# Altium footprint library Lib_001.PcbLib: 429 footprints (part 17 of 28)
Each footprint in its own frame and in the unit in brackets; x right, y up, seen from the top. Pads: shape width x height; smd on the part's side, far side on the other; paste and mask are expansions set on the pad; w line width, h text height; cw(c..) or ccw(c..) is an arc to the next point about the centre after c.
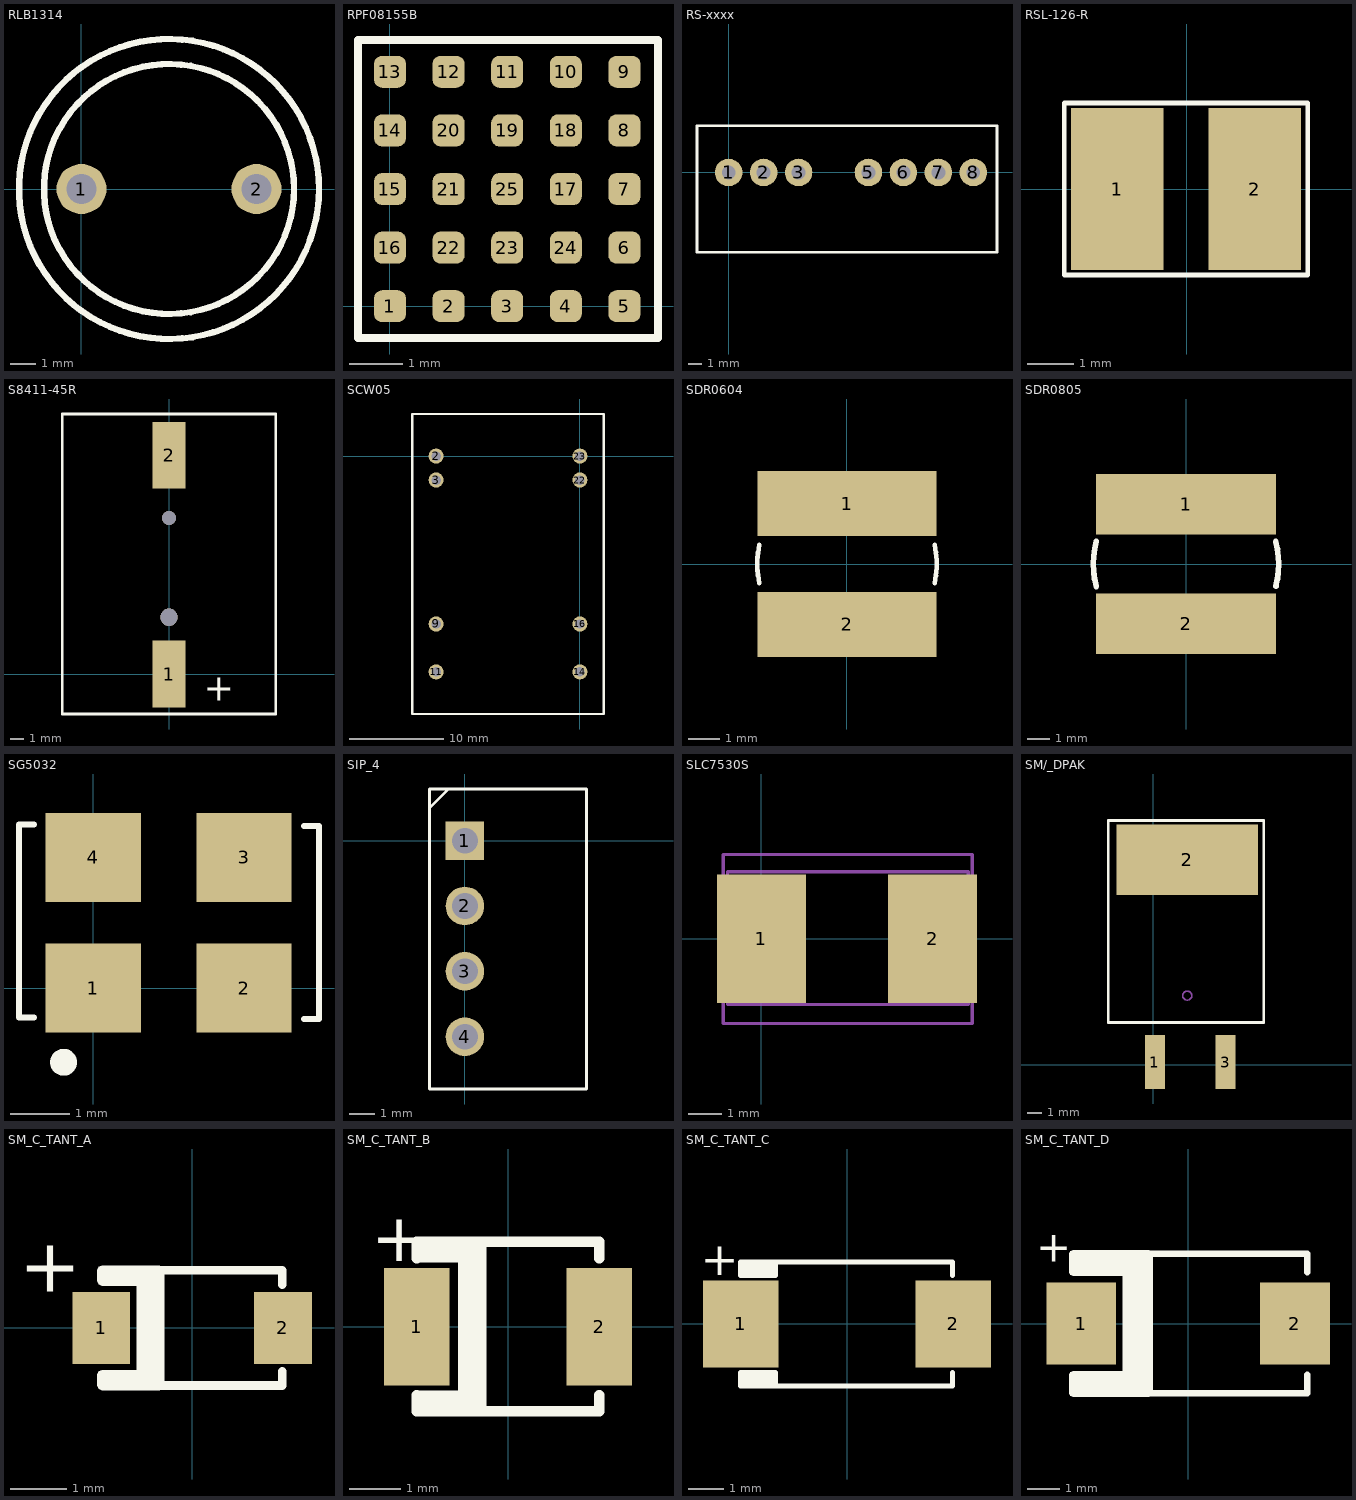
[diagram p16: the footprints below, top view; thin cyan lines are the x and y axes]

## RLB1314 [mm] "RLB1314 Inductor"
height 12
pads (2):
  round 2 hole 1.2: 1(0,0) 2(7,0)
Top Overlay:
  circle w0.254: c3.5,0 r6
  circle w0.254: c3.5,0 r5
Mechanical 1:
  circle w0.1: c3.5,0 r6
  circle w0.1: c3.5,0 r5
3D body: height 1.5, standoff -1.5, extent -0.496,-0.499 0.5,0.499
3D body: height 1.5, standoff -1.5, extent 6.504,-0.499 7.5,0.499
3D body: height 1.5, standoff 0, extent -2.453,-5.988 9.5,5.988
3D body: height 11.5, standoff 1.5, extent -1.46,-4.99 8.5,4.99
3D body: height 11, standoff 10, extent -2.453,-5.988 9.5,5.988

## RPF08155B [mm]
pads (25):
  rrect50% 0.6x0.6 smd: 1(0,0) 2(1.1,0) 3(2.2,0) 4(3.3,0) 5(4.4,0) 6(4.4,1.1) 7(4.4,2.2) 8(4.4,3.3) 9(4.4,4.4) 10(3.3,4.4) 11(2.2,4.4) 12(1.1,4.4) 13(0,4.4) 14(0,3.3) 15(0,2.2) 16(0,1.1) 17(3.3,2.2) 18(3.3,3.3) 19(2.2,3.3) 20(1.1,3.3) 21(1.1,2.2) 22(1.1,1.1) 23(2.2,1.1) 24(3.3,1.1) 25(2.2,2.2)
Top Overlay:
  lines w0.15: -0.6,-0.6 -0.6,5 5.03,5 5.03,-0.6 4.8,-0.6 -0.6,-0.6

## RS-xxxx [mm]
pads (7):
  round 2 hole 1: 1(0,0) 2(2.54,0) 3(5.08,0) 5(10.16,0) 6(12.7,0) 7(15.24,0) 8(17.78,0)
Top Overlay:
  lines w0.2: -2.3,-5.8 -2.3,3.4 19.5,3.4 19.5,-5.8 -2.3,-5.8
3D body "User Library-RECOM_RS_Series.STEP": height 11.1, standoff -3.5, extent -2.3,-5.8 19.5,3.4

## RSL-126-R [mm]
pads (2):
  rect 2x3.5 smd: 1(-1.499,0) 2(1.473,0)
Top Overlay:
  lines w0.1: -2.642,-1.854 2.616,-1.854 2.616,1.854 -2.642,1.854 -2.642,-1.854
3D body "RLS-126.step": height 2.5, standoff -0.1, extent -2.247,-1.588 2.253,1.612

## S8411-45R [mm] "Battery Holder 1220"
pads (2):
  rect 2.5x5 smd: 1(0,0) 2(0,16.4)
via 0,4.25 diameter 1.3 hole 1.3
via 0,11.7 diameter 1.05 hole 1.05
Top Overlay:
  lines w0.2: -8,-3 -8,19.5 8,19.5 8,-3 -8,-3
  text "+" at 2.6,-2 h2
3D body "S8411-45R.step": height 4.35, standoff -0.9, extent -7.374,-1.05 7.375,18.151

## SCW05 [mm] "5 W DC- DC Re g u l a t e d Si n g l e O u t p u t Co n v e r t e r"
pads (8):
  round 1.6 hole 1: 2(-15.24,0) 3(-15.24,-2.54) 9(-15.24,-17.8) 11(-15.24,-22.88) 14(0,-22.88) 16(0,-17.8) 22(0,-2.54) 23(0,0)
Top Overlay:
  lines w0.254: -17.77,-27.34 -17.77,4.46 ; -17.76,-27.34 2.53,-27.34 2.53,4.46 -17.75,4.46
3D body "User Library-SCW05A.step": height 12.33, standoff -3.69, extent -17.73,-27.35 2.57,4.45

## SDR0604 [mm] "SDR0604 Series - SMD Power Inductors"
height 5
pads (2):
  rect 5.8x2.1 smd: 1(0,1.95) 2(0,-1.95)
Top Overlay:
  lines w0.15: -2.833,-0.621 cw(c0,0) -2.833,0.621 ; 2.833,-0.621 ccw(c0,0) 2.833,0.621
3D body "sdr0604-121kl.stp": height 4.8, standoff 0, extent -2.9,-2.9 2.9,2.9

## SDR0805 [mm] "SDR0805 Series - SMD Power Inductors"
height 5.5
pads (2):
  rect 8x2.7 smd: 1(0,2.65) 2(0,-2.65)
Top Overlay:
  lines w0.254: -3.984,-0.996 cw(c0,0) -3.981,1.008 ; 3.984,0.996 cw(c0,0) 3.986,-0.99
3D body "User Library-SDR0805.STEP": height 5.05, standoff 0, extent -3.75,-3.677 3.75,3.677

## SG5032 [mm] "cristal oscillator"
pads (4):
  rect 1.6x1.5 smd: 1(0,0) 2(2.54,0) 3(2.54,2.2) 4(0,2.2)
Top Overlay:
  circle w0.254: c-0.5,-1.25 r0.1
  lines w0.1: -1,-0.5 -1.25,-0.5 -1.25,2.75 -1,2.75 ; 3.55,-0.525 3.8,-0.525 3.8,2.725 3.55,2.725
3D body "User Library-SG5032.STEP": height 1.15, standoff -0.01, extent -1.2,-0.5 3.8,2.7

## SIP_4 [mm]
height 10
pads (4):
  rect 1.5x1.5 hole 1: 1(0,0)
  round 1.5 hole 1: 2(0,-2.54) 3(0,-5.08) 4(0,-7.62)
Top Overlay:
  lines w0.1: -1.372,1.27 -0.635,2.007 ; -1.376,-9.652 4.724,-9.652 4.724,2.007 -1.376,2.007 -1.376,-9.652
3D body "User Library-AM1S-Z.STEP": height 10.15, standoff -3.05, extent -1.376,-9.652 4.724,2.032

## SLC7530S [mm]
pads (2):
  rect 2.7x3.9 smd: 1(0,0) 2(5.2,0)
Top Overlay:
  circle w0.254: c-0.425,-1.225 r0.075
Mechanical 13:
  lines w0.1: -1.025,-2 6.275,-2 6.275,2.025 -1.025,2.025 -1.025,-2
Mechanical 15:
  lines w0.1: -1.15,-2.575 -1.15,2.55 0.687,2.55 4.463,2.55 6.4,2.55 6.4,-2.575 -1.15,-2.575
3D body "Coilcraft-SLC7530S.step": height 2.9, standoff -0.1, extent -1.108,-3.291 6.392,3.409

## SM/_DPAK [mm]
pads (3):
  rect 1.4x3.8 smd: 1(0.1,0.2) 3(5.1,0.2)
  rect 10x5 smd: 2(2.398,14.5)
Top Overlay:
  lines w0.2: -2.997,17.284 7.793,17.284 7.793,2.997 -3.197,2.997 -3.197,17.284 -2.797,17.284
  text ".Designator" at -2.289,17.718 h0.95
Mechanical 3:
  lines w0.102: 2.068,4.899 ccw(c2.386,4.899) 2.386,4.581 ccw(c2.386,4.899) 2.703,4.899 ccw(c2.386,4.899) 2.386,5.216 ccw(c2.386,4.899) 2.068,4.899
3D body "User Library-D2PAK.step": height 4.83, standoff 0, extent -2.64,-0.25 8.03,15.63

## SM_C_TANT_A [mil]
pads (2):
  rect 40x50 smd: 1(-63,0) 2(63,0)
Top Overlay:
  region: -20.2,42.3 -19.25,40 -19.25,-40 -20.2,-42.3 -22.5,-43.25 -62.5,-43.25 -64.8,-42.3 -65.75,-40 -65.75,-32.5 -64.8,-30.2 -62.5,-29.25 -38.25,-29.25 -38.25,29.25 -62.5,29.25 -64.8,30.2 -65.75,32.5 -65.75,40 -64.8,42.3 -62.5,43.25 -22.5,43.25
  lines w6: -62.5,-32.5 -62.5,-40 62.5,-40 62.5,-30 ; -62.5,32.5 -62.5,40 62.5,40 62.5,30
  text "+" at -120,25 h37.5
3D body "User Library-Tantalum Capacitor Case A.STEP": height 65, standoff 0.04, extent -68.71,-29.92 64.77,33.07

## SM_C_TANT_B [mil]
pads (2):
  rect 50x90 smd: 1(-70,0) 2(70,0)
Top Overlay:
  region: -17.7,67.3 -16.75,65 -16.75,-65 -17.7,-67.3 -20,-68.25 -70,-68.25 -72.3,-67.3 -73.25,-65 -73.25,-52.5 -72.3,-50.2 -70,-49.25 -38.25,-49.25 -38.25,49.25 -70,49.25 -72.3,50.2 -73.25,52.5 -73.25,65 -72.3,67.3 -70,68.25 -20,68.25
  lines w8: -70,-52.5 -70,-65 70,-65 70,-52.5 ; -70,52.5 -70,65 70,65 70,52.5
  text "+" at -105,50 h37.5
Mechanical 3:
  text "JK" at -100,-30 h37.5
3D body "User Library-Tantalum Capacitor Case B.STEP": height 80.25, standoff -2.43, extent -71.7,-55.53 73.59,55.5

## SM_C_TANT_C [mil]
pads (2):
  rect 85x98.43 smd: 1(-120,0) 2(120,0)
Top Overlay:
  lines w6: -114.92,-70 -119.92,-70 -119.92,-55 -114.92,-55 ; -114.92,55 -119.92,55 -119.92,70 -114.92,70 ; -110.98,70 -110.98,55 -105.98,55 -105.98,70 -100.98,70 -100.98,55 -95.98,55 -95.98,70 -90.98,70 -90.98,55 -85.98,55 -85.98,70 -80.98,70 -80.98,55 -115.98,55 -115.98,70 119.02,70 119.02,55 ; 119.02,-55 119.02,-70 -115.98,-70 ; -115.98,-70 -115.98,-55 ; -115.98,-70 -110.98,-70 -110.98,-55 -105.98,-55 -105.98,-70 -100.98,-70 -100.98,-55 -95.98,-55 -95.98,-70 -90.98,-70 -90.98,-55 -85.98,-55 -85.98,-70 -80.98,-70 -80.98,-55 -115.98,-55 ; -115.98,-70 -115.98,-55
  text "+" at -165,55 h37.5
3D body "User Library-Tantalum Capacitor Case C.STEP": height 105.27, standoff -0.59, extent -121.76,-62.99 121.75,63.2

## SM_C_TANT_D [mil]
pads (2):
  rect 85x100 smd: 1(-130,0) 2(130,0)
Top Overlay:
  region: -44.44,88.06 -43.17,85 -43.17,-85 -44.44,-88.06 -47.5,-89.33 -140,-89.33 -143.06,-88.06 -144.33,-85 -144.33,-62.5 -143.06,-59.44 -140,-58.17 -79.33,-58.17 -79.33,58.17 -140,58.17 -143.06,59.44 -144.33,62.5 -144.33,85 -143.06,88.06 -140,89.33 -47.5,89.33
  lines w8: -140,-62.5 -140,-85 145,-85 145,-62.5 ; -140,62.5 -140,85 145,85 145,62.5
  text "+" at -185,75 h37.5
Mechanical 3:
  text "JK" at -160,-30 h37.5
3D body "User Library-Tantalum Cap Case D.STEP": height 110.24, standoff 0, extent -130.31,-85.43 150.79,83.86